# Altium footprint library ICs And Semiconductors THD.PcbLib: 507 footprints (part 31 of 32)
Each footprint in its own frame and in the unit in brackets; x right, y up, seen from the top. Pads: shape width x height; smd on the part's side, far side on the other; paste and mask are expansions set on the pad; w line width, h text height; cw(c..) or ccw(c..) is an arc to the next point about the centre after c.
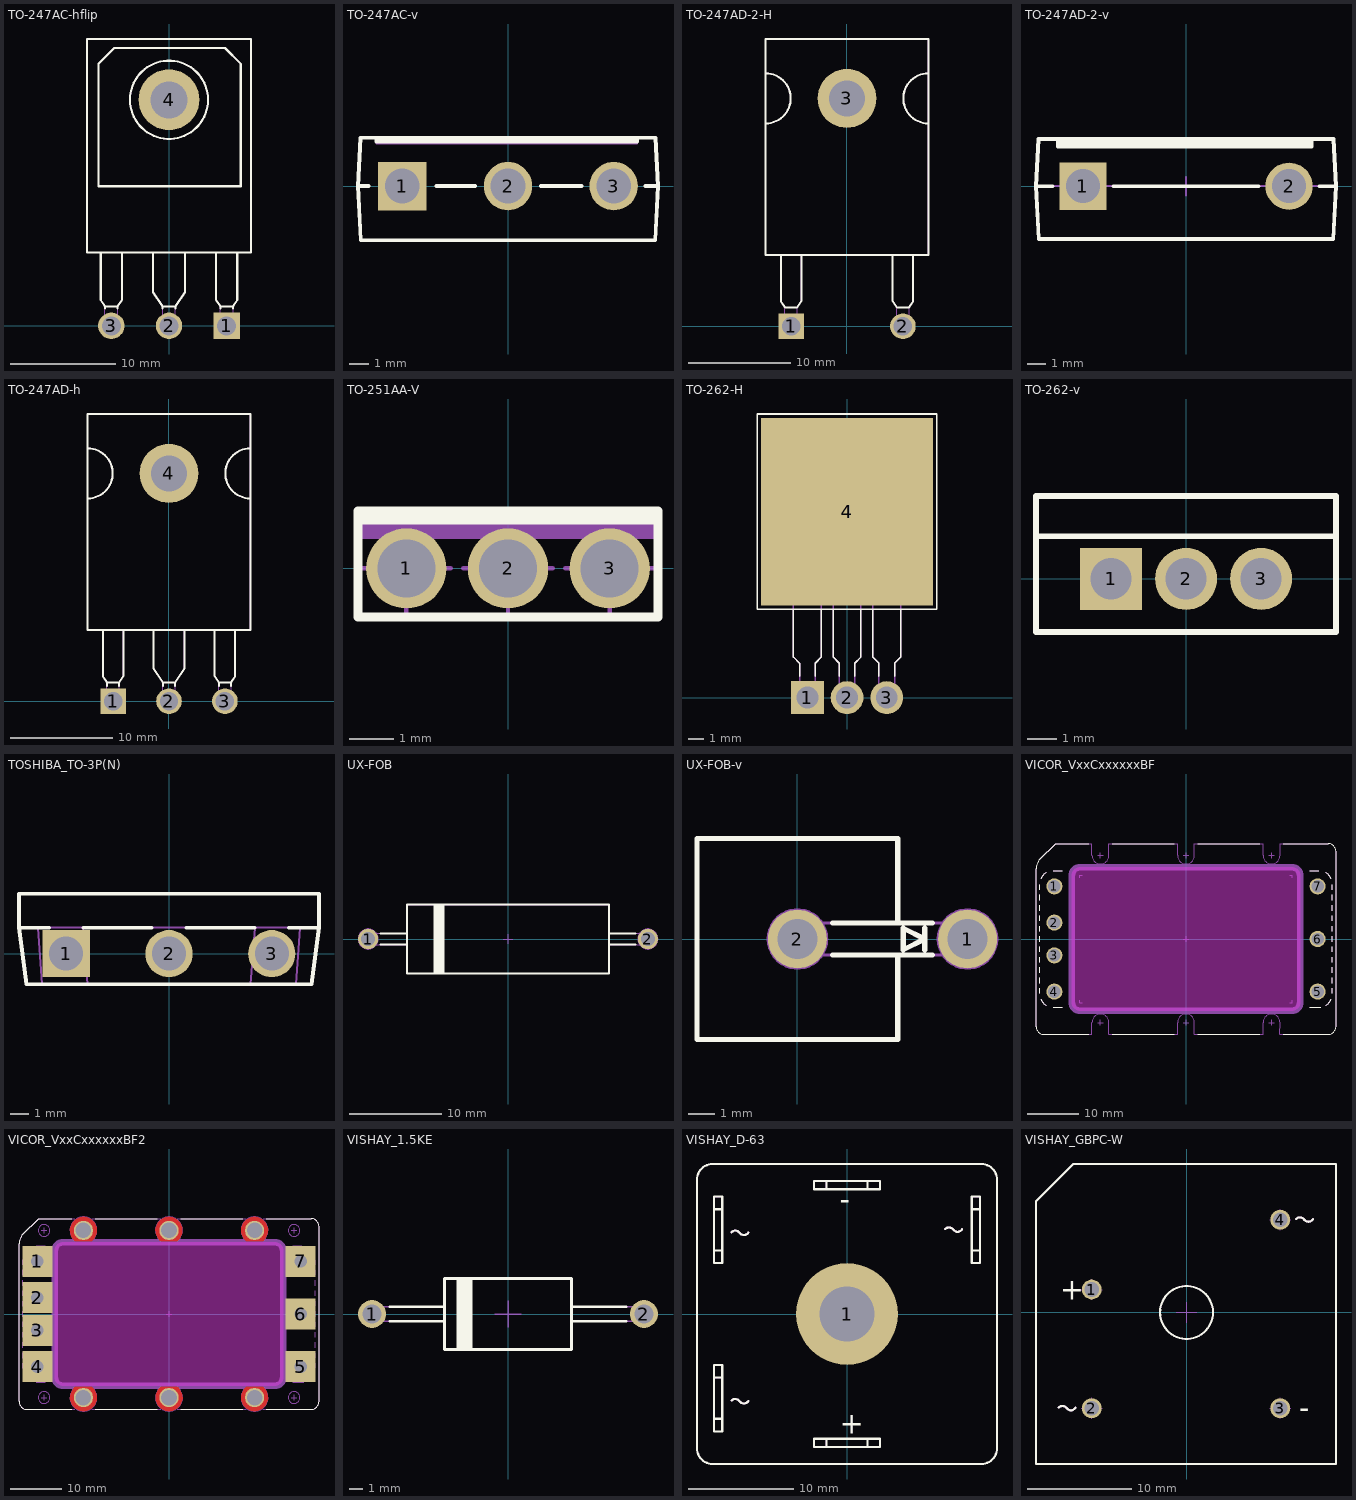
[diagram p30: the footprints below, top view; thin cyan lines are the x and y axes]

## TO-247AC-hflip [mm] "TO-247AC 3-Terminal - Flipped Horizontal Mount"
height 5.3
pads (4):
  rect 2.5x2.5 hole 1.8: 1(5.46,0)
  round 2.5 hole 1.8: 2(0,0) 3(-5.46,0)
  round 5.75 hole 3.5: 4(0,21.39)
Top Overlay:
  circle w0.2: c0,21.39 r3.7
  lines w0.2: -6.46,6.94 -6.46,2.44 -6.06,1.84 ; -6.06,1.65 -6.06,1.84 ; -4.86,1.65 -4.86,1.84 ; -4.46,6.94 -4.46,2.44 -4.86,1.84 ; -1.5,6.94 -1.5,3.19 -0.6,1.84 ; -0.6,1.65 -0.6,1.84 ; 0.6,1.65 0.6,1.84 ; 1.5,6.94 1.5,3.19 0.6,1.84 ; 4.46,6.94 4.46,2.44 4.86,1.84 ; 4.86,1.65 4.86,1.84 ; 6.06,1.65 6.06,1.84 ; 6.46,6.94 6.46,2.44 6.06,1.84 ; -6.06,1.84 -4.86,1.84 ; -0.6,1.84 0.6,1.84 ; 4.86,1.84 6.06,1.84 ; -7.75,6.94 -7.75,27.14 7.75,27.14 7.75,6.94 -7.75,6.94 ; -6.665,13.21 -6.665,24.79 -5.165,26.29 5.295,26.29 6.795,24.79 6.795,13.21 -6.665,13.21
Notvisible:
  lines w0.1: -5.96,0 -5.46,0 ; -5.46,-0.5 -5.46,0 ; -5.46,0.5 -5.46,0 ; -4.96,0 -5.46,0 ; -0.5,0 0,0 ; -0.5,21.39 0,21.39 ; 0,-0.5 0,0 ; 0,0.5 0,0 ; 0,20.89 0,21.39 ; 0,21.89 0,21.39 ; 0.5,0 0,0 ; 0.5,21.39 0,21.39 ; 4.96,0 5.46,0 ; 5.46,-0.5 5.46,0 ; 5.46,0.5 5.46,0 ; 5.96,0 5.46,0
Mechanical 14:
  circle w0.1: c0,21.39 r1.75
  circle w0.1: c0,21.39 r3.7
  lines w0.1: -6.46,6.94 -6.46,2.44 -6.06,1.84 ; -4.46,6.94 -4.46,2.44 -4.86,1.84 ; -1.5,6.94 -1.5,3.19 -0.6,1.84 ; 1.5,6.94 1.5,3.19 0.6,1.84 ; 4.46,6.94 4.46,2.44 4.86,1.84 ; 6.46,6.94 6.46,2.44 6.06,1.84 ; -6.06,1.84 -6.06,-0.5 -4.86,-0.5 -4.86,1.84 ; -6.06,1.84 -4.86,1.84 ; -0.6,1.84 -0.6,-0.5 0.6,-0.5 0.6,1.84 ; -0.6,1.84 0.6,1.84 ; 4.86,1.84 6.06,1.84 ; 4.86,1.84 4.86,-0.5 6.06,-0.5 6.06,1.84 ; -7.75,6.94 -7.75,27.14 7.75,27.14 7.75,6.94 -7.75,6.94 ; -6.665,13.21 -6.665,24.79 -5.165,26.29 5.295,26.29 6.795,24.79 6.795,13.21 -6.665,13.21
3D body "TO-247AC-HFLIP.stp": height 5.3, standoff -3.6, extent -7.75,-0.5 7.75,27.14

## TO-247AC-v [mm] "TO-247AC 3-Terminal - Vertical Mount"
height 25
pads (3):
  rect 2.5x2.5 hole 1.8: 1(-5.46,0)
  round 2.5 hole 1.8: 2(0,0) 3(5.46,0)
Top Overlay:
  lines w0.2: -7.728,0 -7.2,0 ; -6.795,2.5 -6.795,2.3 6.665,2.3 6.665,2.5 ; -3.7,0 -1.7,0 ; 1.7,0 3.8,0 ; 7.1,0 7.75,0 ; 7.75,0 7.61,-2.8 -7.61,-2.8 -7.75,0 -7.62,2.5 7.62,2.5 7.75,0
Notvisible:
  lines w0.1: -5.96,0 -5.46,0 ; -5.46,-0.5 -5.46,0 ; -5.46,0.5 -5.46,0 ; -4.96,0 -5.46,0 ; -0.5,0 0,0 ; 0,-0.5 0,0 ; 0,0.5 0,0 ; 0.5,0 0,0 ; 4.96,0 5.46,0 ; 5.46,-0.5 5.46,0 ; 5.46,0.5 5.46,0 ; 5.96,0 5.46,0
Mechanical 14:
  lines w0.1: -6.795,2.3 6.665,2.3 ; -6.795,2.4 6.665,2.4 ; -6.795,2.5 -6.795,2.2 6.665,2.2 6.665,2.5 ; -7.75,0 -7.61,-2.8 7.61,-2.8 7.75,0 7.62,2.5 -7.62,2.5 -7.75,0
3D body "TO-247AC-V.stp": height 26.75, standoff -3.6, extent -7.75,-2.8 7.75,2.5

## TO-247AD-2-H [mm] "TO-247AD 2-Terminal - Horizontal Mount"
height 5.3
pads (3):
  rect 2.5x2.5 hole 1.8: 1(-5.46,0)
  round 2.5 hole 1.8: 2(5.46,0)
  round 5.75 hole 3.5: 3(0,22.24)
Top Overlay:
  lines w0.2: -7.95,19.79 ccw(c-7.95,22.24) -7.95,24.69 ; -6.46,6.94 -6.46,2.44 -6.06,1.84 -4.86,1.84 -4.46,2.44 -4.46,6.94 ; 4.46,6.94 4.46,2.44 4.86,1.84 6.06,1.84 6.46,2.44 6.46,6.94 ; 7.95,19.79 cw(c7.95,22.24) 7.95,24.69 ; -7.95,6.94 -7.95,28.04 7.95,28.04 7.95,6.94 -7.95,6.94
Notvisible:
  lines w0.1: -5.96,0 -5.46,0 ; -5.46,-0.5 -5.46,0 ; -5.46,0.5 -5.46,0 ; -4.96,0 -5.46,0 ; -0.5,22.24 0,22.24 ; 0,21.74 0,22.24 ; 0,22.74 0,22.24 ; 0.5,22.24 0,22.24 ; 4.96,0 5.46,0 ; 5.46,-0.5 5.46,0 ; 5.46,0.5 5.46,0 ; 5.96,0 5.46,0
Mechanical 14:
  circle w0.1: c0,22.24 r1.75
  lines w0.1: -7.95,19.79 ccw(c-7.95,22.24) -7.95,24.69 ; -6.46,6.94 -6.46,2.44 -6.06,1.84 ; -4.46,6.94 -4.46,2.44 -4.86,1.84 ; 4.46,6.94 4.46,2.44 4.86,1.84 ; 6.46,6.94 6.46,2.44 6.06,1.84 ; 7.95,19.79 cw(c7.95,22.24) 7.95,24.69 ; -6.06,1.84 -6.06,-0.5 -4.86,-0.5 -4.86,1.84 ; -6.06,1.84 -4.86,1.84 ; 4.86,1.84 6.06,1.84 ; 4.86,1.84 4.86,-0.5 6.06,-0.5 6.06,1.84 ; -7.95,6.94 -7.95,28.04 7.95,28.04 7.95,6.94 -7.95,6.94
3D body "TO-247AD-2-H.stp": height 5.3, standoff -3.9, extent -7.95,-0.5 7.95,28.04

## TO-247AD-2-v [mm] "TO-247AD 2-Terminal - Vertical Mount"
height 25
pads (2):
  rect 2.5x2.5 hole 1.8: 1(-5.46,0)
  round 2.5 hole 1.8: 2(5.46,0)
Top Overlay:
  lines w0.2: -7.06,0 -7.95,0 ; -6.795,2.3 6.665,2.3 ; -6.795,2.5 -6.795,2.1 6.665,2.1 6.665,2.5 ; -3.86,0 3.86,0 ; 7.06,0 7.95,0 ; -7.95,0 -7.81,-2.8 7.81,-2.8 7.95,0 ; -7.95,0 -7.82,2.5 7.82,2.5 7.95,0
Notvisible:
  lines w0.1: -5.96,0 -5.46,0 ; -5.46,-0.5 -5.46,0 ; -5.46,0.5 -5.46,0 ; -4.96,0 -5.46,0 ; -0.5,0 0,0 ; 0,-0.5 0,0 ; 0,0.5 0,0 ; 0.5,0 0,0 ; 4.96,0 5.46,0 ; 5.46,-0.5 5.46,0 ; 5.46,0.5 5.46,0 ; 5.96,0 5.46,0
Mechanical 14:
  lines w0.1: -6.795,2.2 6.665,2.2 ; -6.795,2.3 6.665,2.3 ; -6.795,2.4 6.665,2.4 ; -6.795,2.5 -6.795,2.1 6.665,2.1 6.665,2.5 ; -7.95,0 7.95,0 ; -7.95,0 -7.81,-2.8 7.81,-2.8 7.95,0 ; -7.95,0 -7.82,2.5 7.82,2.5 7.95,0
3D body "TO-247AD-2-V.stp": height 26.2, standoff -5.05, extent -7.95,-2.8 7.95,2.5

## TO-247AD-h [mm] "TO-247AD 3-Terminal - Horizontal Mount"
height 5.3
pads (4):
  rect 2.5x2.5 hole 1.8: 1(-5.46,0)
  round 2.5 hole 1.8: 2(0,0) 3(5.46,0)
  round 5.75 hole 3.5: 4(0,22.24)
Top Overlay:
  lines w0.2: -7.95,19.79 ccw(c-7.95,22.24) -7.95,24.69 ; -6.46,6.94 -6.46,2.44 -6.06,1.84 ; -6.06,1.5 -6.06,1.84 ; -4.86,1.5 -4.86,1.84 ; -4.46,6.94 -4.46,2.44 -4.86,1.84 ; -1.5,6.94 -1.5,3.19 -0.6,1.84 ; -0.6,1.5 -0.6,1.84 ; 0.6,1.5 0.6,1.84 ; 1.5,6.94 1.5,3.19 0.6,1.84 ; 4.46,6.94 4.46,2.44 4.86,1.84 ; 4.86,1.5 4.86,1.84 ; 6.06,1.5 6.06,1.84 ; 6.46,6.94 6.46,2.44 6.06,1.84 ; 7.95,19.79 cw(c7.95,22.24) 7.95,24.69 ; -6.06,1.84 -4.86,1.84 ; -0.6,1.84 0.6,1.84 ; 4.86,1.84 6.06,1.84 ; -7.95,6.94 -7.95,28.04 7.95,28.04 7.95,6.94 -7.95,6.94
Notvisible:
  lines w0.1: -5.96,0 -5.46,0 ; -5.46,-0.5 -5.46,0 ; -5.46,0.5 -5.46,0 ; -4.96,0 -5.46,0 ; -0.5,0 0,0 ; -0.5,22.24 0,22.24 ; 0,-0.5 0,0 ; 0,0.5 0,0 ; 0,21.74 0,22.24 ; 0,22.74 0,22.24 ; 0.5,0 0,0 ; 0.5,22.24 0,22.24 ; 4.96,0 5.46,0 ; 5.46,-0.5 5.46,0 ; 5.46,0.5 5.46,0 ; 5.96,0 5.46,0
Mechanical 14:
  circle w0.1: c0,22.24 r1.75
  lines w0.1: -7.95,19.79 ccw(c-7.95,22.24) -7.95,24.69 ; -6.46,6.94 -6.46,2.44 -6.06,1.84 ; -4.46,6.94 -4.46,2.44 -4.86,1.84 ; -1.5,6.94 -1.5,3.19 -0.6,1.84 ; 1.5,6.94 1.5,3.19 0.6,1.84 ; 4.46,6.94 4.46,2.44 4.86,1.84 ; 6.46,6.94 6.46,2.44 6.06,1.84 ; 7.95,19.79 cw(c7.95,22.24) 7.95,24.69 ; -6.06,1.84 -6.06,-0.5 -4.86,-0.5 -4.86,1.84 ; -6.06,1.84 -4.86,1.84 ; -0.6,1.84 -0.6,-0.5 0.6,-0.5 0.6,1.84 ; -0.6,1.84 0.6,1.84 ; 4.86,1.84 6.06,1.84 ; 4.86,1.84 4.86,-0.5 6.06,-0.5 6.06,1.84 ; -7.95,6.94 -7.95,28.04 7.95,28.04 7.95,6.94 -7.95,6.94
3D body "TO-247AD-H.stp": height 5.3, standoff -3.9, extent -7.95,-0.5 7.95,28.04

## TO-251AA-V [mm] "TO-251AA 3-Terminal - Vertical Mount"
height 10.5
pads (3):
  round 1.8 hole 1.3: 1(-2.28,0) 2(0,0) 3(2.28,0)
Top Overlay:
  lines w0.2: -3.365,1.09 3.365,1.09 ; -3.365,-1.09 -3.365,1.29 3.365,1.29 3.365,-1.09 -3.365,-1.09
Notvisible:
  lines w0.1: -3.28,0 -2.28,0 ; -2.28,-1 -2.28,0 ; -2.28,1 -2.28,0 ; -1.28,0 -2.28,0 ; -1,0 0,0 ; 0,-1 0,0 ; 0,1 0,0 ; 1,0 0,0 ; 1.28,0 2.28,0 ; 2.28,-1 2.28,0 ; 2.28,1 2.28,0 ; 3.28,0 2.28,0
Mechanical 14:
  lines w0.1: -3.365,0.71 3.365,0.71 ; -3.365,0.79 3.365,0.79 ; -3.365,0.89 3.365,0.89 ; -3.365,0.99 3.365,0.99 ; -3.365,1.09 3.365,1.09 ; -3.365,1.19 3.365,1.19 ; -3.365,-1.09 3.365,-1.09 3.365,1.29 -3.365,1.29 -3.365,-1.09
3D body "TO-251AA-V.stp": height 10.49, standoff -3.2, extent -3.365,-1.09 3.365,1.29

## TO-262-H [mm] "TO-262 3-Terminal + Tab - Horizontal Mount"
height 4.83
pads (4):
  rect 2.1x2.1 hole 1.4: 1(-2.54,0)
  round 2.1 hole 1.4: 2(0,0) 3(2.54,0)
  rect 11x12 smd paste-5.5: 4(-0.002,11.898)
Top Overlay:
  lines w0.1: -3.43,5.648 -3.43,2.59 -3.04,2.2 -3.04,1.361 ; -2.04,1.361 -2.04,2.2 -1.65,2.59 -1.65,5.648 ; -0.89,5.648 -0.89,2.59 -0.5,2.2 -0.5,1.361 ; 0.5,1.361 0.5,2.2 0.89,2.59 0.89,5.648 ; 1.65,5.648 1.65,2.59 2.04,2.2 2.04,1.361 ; 3.04,1.361 3.04,2.2 3.43,2.59 3.43,5.648 ; -5.752,5.648 -5.752,18.148 5.748,18.148 5.748,5.648 -5.752,5.648
Notvisible:
  lines w0.1: -3.04,0 -2.54,0 ; -2.54,-0.5 -2.54,0 ; -2.54,0.5 -2.54,0 ; -2.04,0 -2.54,0 ; -0.5,0 0,0 ; 0,-0.5 0,0 ; 0,0.5 0,0 ; 0.5,0 0,0 ; 2.04,0 2.54,0 ; 2.54,-0.5 2.54,0 ; 2.54,0.5 2.54,0 ; 3.04,0 2.54,0
  text "This Pad" at -3.8,9.75 h1
  text "Mask on" at -3.5,11.425 h1
  text "No Paste" at -3.725,13 h1
Mechanical 13:
  lines w0.2: -5.083,6.7 -5.083,6.3 -4.5,6.3
Mechanical 14:
  lines w0.1: -5.083,15.815 5.077,15.815 ; -3.43,6.3 -3.43,2.59 -3.04,2.2 -3.04,-0.25 -2.04,-0.25 -2.04,2.2 -1.65,2.59 -1.65,6.3 ; -0.89,6.3 -0.89,2.59 -0.5,2.2 -0.5,-0.25 0.5,-0.25 0.5,2.2 0.89,2.59 0.89,6.3 ; 1.65,6.3 1.65,2.59 2.04,2.2 2.04,-0.25 3.04,-0.25 3.04,2.2 3.43,2.59 3.43,6.3 ; -5.083,6.3 -5.083,16.86 -3.338,17.495 3.333,17.495 5.077,16.86 5.077,6.3 -5.083,6.3
3D body "TO-262-H.stp": height 4.6, standoff -3.6, extent -5.082,-0.25 5.078,17.495

## TO-262-v [mm] "TO-262 3-Terminal - Vertical Mount"
height 15.01
pads (3):
  rect 2.1x2.1 hole 1.4: 1(-2.54,0)
  round 2.1 hole 1.4: 2(0,0) 3(2.54,0)
Top Overlay:
  lines w0.2: -5.082,1.445 5.078,1.445 ; -5.082,-1.795 -5.082,2.805 5.078,2.805 5.078,-1.795 -5.082,-1.795
Notvisible:
  lines w0.1: -3.04,0 -2.54,0 ; -2.54,-0.5 -2.54,0 ; -2.54,0.5 -2.54,0 ; -2.04,0 -2.54,0 ; -0.5,0 0,0 ; 0,-0.5 0,0 ; 0,0.5 0,0 ; 0.5,0 0,0 ; 2.04,0 2.54,0 ; 2.54,-0.5 2.54,0 ; 2.54,0.5 2.54,0 ; 3.04,0 2.54,0
Mechanical 14:
  lines w0.1: -5.082,1.445 5.078,1.445 ; -5.082,-1.795 -5.082,2.805 5.078,2.805 5.078,-1.795 -5.082,-1.795
3D body "TO-262-V.stp": height 15.3, standoff -3.6, extent -5.082,-1.795 5.078,2.805

## TOSHIBA_TO-3P(N) [mm] "TOSHIBA TO-3P(N) 3-Terminal - Vertical Mount"
height 25.5
pads (3):
  rect 2.5x2.5 hole 1.8: 1(-5.45,0)
  round 2.5 hole 1.8: 2(0,0) 3(5.45,0)
Top Overlay:
  lines w0.2: -6.362,1.375 -7.95,1.375 ; -4.538,1.375 -0.912,1.375 ; 0.912,1.375 4.538,1.375 ; 6.362,1.375 7.95,1.375 ; -7.95,1.375 -7.55,-1.625 0,-1.625 7.55,-1.625 7.95,1.375 ; -7.95,1.375 -7.95,3.175 0,3.175 7.95,3.175 7.95,1.375
Notvisible:
  lines w0.1: -6.45,0 -5.45,0 ; -5.45,-1 -5.45,0 ; -5.45,1 -5.45,0 ; -4.45,0 -5.45,0 ; -1,0 0,0 ; 0,-1 0,0 ; 0,1 0,0 ; 1,0 0,0 ; 4.45,0 5.45,0 ; 5.45,-1 5.45,0 ; 5.45,1 5.45,0 ; 6.45,0 5.45,0
Mechanical 14:
  lines w0.1: -6.95,1.375 -6.724,-1.625 ; -4.55,1.375 -4.324,-1.625 ; 4.324,-1.625 4.55,1.375 ; 6.724,-1.625 6.95,1.375 ; -7.95,1.375 0,1.375 7.95,1.375 ; -7.95,1.375 -7.55,-1.625 0,-1.625 7.55,-1.625 7.95,1.375 ; -7.95,1.375 -7.95,3.175 0,3.175 7.95,3.175 7.95,1.375
3D body "TOSHIBA_TO-3P(N)_v.stp": height 25.5, standoff -3.8, extent -7.95,-1.625 7.95,3.175

## UX-FOB [mm] "Diode High Voltage, Rectangular; Lead Spacing 30.48mm, Lead Dia. 1.2mm, Body Length 22mm, Body Height 7.5mm"
height 7.5
pads (2):
  round 2.2 hole 1.5: 1(-15.24,0) 2(15.24,0)
Top Overlay:
  lines w0.2: -13.92,-0.6 -11,-0.6 ; -13.92,0.6 -11,0.6 ; -8,-3.75 -8,3.75 ; -7.9,-3.75 -7.9,3.75 ; -7.8,-3.75 -7.8,3.75 ; -7.7,-3.75 -7.7,3.75 ; -7.6,-3.75 -7.6,3.75 ; -7.5,-3.75 -7.5,3.75 ; -7.4,-3.75 -7.4,3.75 ; -7.3,-3.75 -7.3,3.75 ; -7.2,-3.75 -7.2,3.75 ; -7.1,-3.75 -7.1,3.75 ; -7,-3.75 -7,3.75 ; 11,-0.6 13.92,-0.6 ; 11,0.6 13.92,0.6 ; -11,-3.75 11,-3.75 11,3.75 -11,3.75 -11,-3.75
Notvisible:
  circle w0.05: c-15.24,0 r0.75
  circle w0.05: c-15.24,0 r1.1
  circle w0.05: c15.24,0 r1.1
  circle w0.05: c15.24,0 r0.75
  lines w0.05: -15.74,0 -15.24,0 ; -15.24,-0.5 -15.24,0 ; -15.24,0.5 -15.24,0 ; -14.74,0 -15.24,0 ; -0.5,0 0,0 ; 0,-0.5 0,0 ; 0,0.5 0,0 ; 0.5,0 0,0 ; 14.74,0 15.24,0 ; 15.24,-0.5 15.24,0 ; 15.24,0.5 15.24,0 ; 15.74,0 15.24,0
Mechanical 14:
  lines w0.1: -11,-0.6 -15.24,-0.6 cw(c-15.24,0) -15.24,0.6 -11,0.6 ; -8,-3.75 -8,3.75 ; -7.9,-3.75 -7.9,3.75 ; -7.8,-3.75 -7.8,3.75 ; -7.7,-3.75 -7.7,3.75 ; -7.6,-3.75 -7.6,3.75 ; -7.5,-3.75 -7.5,3.75 ; -7.4,-3.75 -7.4,3.75 ; -7.3,-3.75 -7.3,3.75 ; -7.2,-3.75 -7.2,3.75 ; -7.1,-3.75 -7.1,3.75 ; -7,-3.75 -7,3.75 ; 11,-0.6 15.24,-0.6 ccw(c15.24,0) 15.24,0.6 11,0.6 ; -11,-3.75 11,-3.75 11,3.75 -11,3.75 -11,-3.75
3D body "UX-FOB_Part2.stp": height 4.35, standoff -3.1, extent 6,-0.6 15.84,0.6
3D body "UX-FOB_Part2.stp": height 4.35, standoff -3.1, extent -15.84,-0.6 -6,0.6
3D body "UX-FOB_Part1.stp": height 7.5, standoff 0, extent -11,-3.75 11,3.75

## UX-FOB-v [mm] "Diode High Voltage, Axial, Vertical Mount; Lead Spacing 6.35mm, Lead Dia. 1.2mm, Body Length 22mm, Body Height 7.5mm"
height 25.6
pads (2):
  round 2.2 hole 1.5: 1(6.35,0) 2(0,0)
Top Overlay:
  lines w0.2: 1.32,-0.6 5.03,-0.6 ; 1.32,0.6 5.03,0.6 ; 3.75,-0.6 3.75,-3.75 -3.75,-3.75 -3.75,3.75 3.75,3.75 3.75,0.6 ; 4.75,-0.4 4.75,0.4 ; 3.95,-0.4 4.75,0 3.95,0.4 3.95,-0.4
Notvisible:
  circle w0.1: c6.35,0 r1.1
  circle w0.1: c6.35,0 r0.75
  circle w0.1: c0,0 r1.1
  circle w0.1: c0,0 r0.75
  lines w0.1: -0.5,0 0,0 ; 0,-0.5 0,0 ; 0,0.5 0,0 ; 0.5,0 0,0 ; 5.85,0 6.35,0 ; 6.35,-0.5 6.35,0 ; 6.35,0.5 6.35,0 ; 6.85,0 6.35,0
Mechanical 14:
  lines w0.1: 3.75,-0.6 3.75,-3.75 -3.75,-3.75 -3.75,3.75 3.75,3.75 3.75,0.6 ; 4.75,-0.4 4.75,0.4 ; 0,-0.6 cw(c0,0) 0,0.6 6.35,0.6 cw(c6.35,0) 6.35,-0.6 0,-0.6 ; 3.95,-0.4 4.75,0 3.95,0.4 3.95,-0.4
3D body "UX-FOB-v_Part2.stp": height 25.6, standoff -3.1, extent -0.6,-0.6 6.95,0.6
3D body "UX-FOB-v_Part1.stp": height 22, standoff -3.1, extent -3.75,-3.75 3.75,3.75

## VICOR_VxxCxxxxxxBF [mm] "VICOR  Micro DC-DC Converters, Short Pin RoHS, Slotted Baseplate"
height 12.7
pads (7):
  round 3.1 hole 2.4: 1(-25.4,10.16) 2(-25.4,3.175) 3(-25.4,-3.175) 4(-25.4,-10.16) 5(25.4,-10.16) 6(25.4,0) 7(25.4,10.16)
Top Overlay:
  lines w0.2: -28.194,-10.517 -28.194,-9.5 ; -28.194,-8.5 -28.194,-7.5 ; -28.194,-6.5 -28.194,-5.5 ; -28.194,-4.5 -28.194,-3.5 ; -28.194,-2.5 -28.194,-1.5 ; -28.194,-0.5 -28.194,0.5 ; -28.194,1.5 -28.194,2.5 ; -28.194,3.5 -28.194,4.5 ; -28.194,5.5 -28.194,6.5 ; -28.194,7.5 -28.194,8.5 ; -28.194,9.5 -28.194,10.517 ; -28,-11.642 ccw(c-25.655,-10.669) -27,-12.822 ; -28,11.642 cw(c-25.655,10.669) -27,12.822 ; -25.655,-13.208 -23.911,-13.208 ; -25.655,13.208 -23.911,13.208 ; -18.82,-18.415 -27.432,-18.415 cw(c-27.432,-16.891) -28.956,-16.891 -28.956,13.553 cw(c-26.416,13.553) -28.212,15.349 -25.146,18.415 -18.82,18.415 ; -14.2,-18.415 -2.31,-18.415 ; -14.2,18.415 -2.31,18.415 ; 2.31,-18.415 14.2,-18.415 ; 2.31,18.415 14.2,18.415 ; 18.82,-18.415 27.432,-18.415 ccw(c27.432,-16.891) 28.956,-16.891 28.956,16.891 ccw(c27.432,16.891) 27.432,18.415 18.82,18.415 ; 23.911,-13.208 25.655,-13.208 ccw(c25.655,-10.669) 26,-13.184 ; 23.911,13.208 25.655,13.208 ; 27,-12.822 ccw(c25.655,-10.669) 28,-11.642 ; 27,12.822 cw(c25.655,10.669) 28,11.642 ; 28.194,-10.517 28.194,-9.5 ; 28.194,-8.5 28.194,-7.5 ; 28.194,-6.5 28.194,-5.5 ; 28.194,-4.5 28.194,-3.5 ; 28.194,-2.5 28.194,-1.5 ; 28.194,-0.5 28.194,0.5 ; 28.194,1.5 28.194,2.5 ; 28.194,3.5 28.194,4.5 ; 28.194,5.5 28.194,6.5 ; 28.194,7.5 28.194,8.5 ; 28.194,9.5 28.194,10.517
Keep-Out Layer:
  board cut-out: -20.52,-13.836 -20.668,-13.836 -20.958,-13.778 -21.231,-13.665 -21.476,-13.501 -21.685,-13.292 -21.849,-13.046 -21.962,-12.773 -22.02,-12.483 -22.02,-12.336 -22.02,12.35 -22.02,12.498 -21.962,12.788 -21.849,13.061 -21.685,13.306 -21.476,13.515 -21.231,13.68 -20.958,13.793 -20.668,13.85 -20.52,13.85 20.52,13.85 20.668,13.85 20.958,13.793 21.231,13.68 21.476,13.515 21.685,13.306 21.849,13.061 21.962,12.788 22.02,12.498 22.02,12.35 22.02,-12.336 22.02,-12.483 21.962,-12.773 21.849,-13.046 21.685,-13.292 21.476,-13.501 21.231,-13.665 20.958,-13.778 20.668,-13.836 20.52,-13.836
Mechanical 1:
  lines w1.27: -22.02,-12.343 ccw(c-20.52,-12.343) -20.52,-13.843 20.52,-13.843 ccw(c20.52,-12.343) 22.02,-12.343 22.02,12.343 ccw(c20.52,12.343) 20.52,13.843 -20.52,13.843 ccw(c-20.52,12.343) -22.02,12.343 -22.02,-12.343
Notvisible:
  lines w0.1: -25.9,-10.16 -25.4,-10.16 ; -25.9,-3.175 -25.4,-3.175 ; -25.9,3.175 -25.4,3.175 ; -25.9,10.16 -25.4,10.16 ; -25.4,-10.66 -25.4,-10.16 ; -25.4,-9.66 -25.4,-10.16 ; -25.4,-3.675 -25.4,-3.175 ; -25.4,-2.675 -25.4,-3.175 ; -25.4,2.675 -25.4,3.175 ; -25.4,3.675 -25.4,3.175 ; -25.4,9.66 -25.4,10.16 ; -25.4,10.66 -25.4,10.16 ; -24.9,-10.16 -25.4,-10.16 ; -24.9,-3.175 -25.4,-3.175 ; -24.9,3.175 -25.4,3.175 ; -24.9,10.16 -25.4,10.16 ; -20.52,-11.843 -20.52,-12.343 -20.02,-12.343 ; -20.52,11.843 -20.52,12.343 -20.02,12.343 ; -17.01,-16.129 -16.51,-16.129 ; -17.01,16.129 -16.51,16.129 ; -16.51,-16.629 -16.51,-16.129 ; -16.51,-15.629 -16.51,-16.129 ; -16.51,15.629 -16.51,16.129 ; -16.51,16.629 -16.51,16.129 ; -16.01,-16.129 -16.51,-16.129 ; -16.01,16.129 -16.51,16.129 ; -0.5,-16.129 0,-16.129 ; -0.5,0 0,0 ; -0.5,16.129 0,16.129 ; 0,-16.629 0,-16.129 ; 0,-15.629 0,-16.129 ; 0,-0.5 0,0 ; 0,0.5 0,0 ; 0,15.629 0,16.129 ; 0,16.629 0,16.129 ; 0.5,-16.129 0,-16.129 ; 0.5,0 0,0 ; 0.5,16.129 0,16.129 ; 16.01,-16.129 16.51,-16.129 ; 16.01,16.129 16.51,16.129 ; 16.51,-16.629 16.51,-16.129 ; 16.51,-15.629 16.51,-16.129 ; 16.51,15.629 16.51,16.129 ; 16.51,16.629 16.51,16.129 ; 17.01,-16.129 16.51,-16.129 ; 17.01,16.129 16.51,16.129 ; 20.02,-12.343 20.52,-12.343 20.52,-11.843 ; 20.02,12.343 20.52,12.343 20.52,11.843 ; 24.9,-10.16 25.4,-10.16 ; 24.9,0 25.4,0 ; 24.9,10.16 25.4,10.16 ; 25.4,-10.66 25.4,-10.16 ; 25.4,-9.66 25.4,-10.16 ; 25.4,-0.5 25.4,0 ; 25.4,0.5 25.4,0 ; 25.4,9.66 25.4,10.16 ; 25.4,10.66 25.4,10.16 ; 25.9,-10.16 25.4,-10.16 ; 25.9,0 25.4,0 ; 25.9,10.16 25.4,10.16 ; -22.02,-12.343 ccw(c-20.52,-12.343) -20.52,-13.843 20.52,-13.843 ccw(c20.52,-12.343) 22.02,-12.343 22.02,12.343 ccw(c20.52,12.343) 20.52,13.843 -20.52,13.843 ccw(c-20.52,12.343) -22.02,12.343 -22.02,-12.343
Mechanical 14:
  lines w0.1: -28.956,-16.891 -28.956,13.553 ; -28.212,15.349 -25.146,18.415 -18.148,18.415 -18.148,16.129 ccw(c-16.51,16.129) -14.872,16.129 -14.872,18.415 -1.638,18.415 -1.638,16.129 ccw(c0,16.129) 1.638,16.129 1.638,18.415 14.872,18.415 14.872,16.129 ccw(c16.51,16.129) 18.148,16.129 18.148,18.415 27.432,18.415 ; -28.194,-10.517 -28.194,-9.5 ; -28.194,-8.5 -28.194,-7.5 ; -28.194,-6.5 -28.194,-5.5 ; -28.194,-4.5 -28.194,-3.5 ; -28.194,-2.5 -28.194,-1.5 ; -28.194,-0.5 -28.194,0.5 ; -28.194,1.5 -28.194,2.5 ; -28.194,3.5 -28.194,4.5 ; -28.194,5.5 -28.194,6.5 ; -28.194,7.5 -28.194,8.5 ; -28.194,9.5 -28.194,10.517 ; -28,-11.642 ccw(c-25.655,-10.669) -27,-12.822 ; -28,11.642 cw(c-25.655,10.669) -27,12.822 ; -27.432,-18.415 -18.148,-18.415 -18.148,-16.129 cw(c-16.51,-16.129) -14.872,-16.129 -14.872,-18.415 -1.638,-18.415 -1.638,-16.129 cw(c0,-16.129) 1.638,-16.129 1.638,-18.415 14.872,-18.415 14.872,-16.129 cw(c16.51,-16.129) 18.148,-16.129 18.134,-18.415 27.432,-18.415 ; -25.655,-13.208 -23.911,-13.208 ; -25.655,13.208 -23.911,13.208 ; 23.911,-13.208 25.655,-13.208 ccw(c25.655,-10.669) 26,-13.184 ; 23.911,13.208 25.655,13.208 ; 27,-12.822 ccw(c25.655,-10.669) 28,-11.642 ; 27,12.822 cw(c25.655,10.669) 28,11.642 ; 28.194,-10.517 28.194,-9.5 ; 28.194,-8.5 28.194,-7.5 ; 28.194,-6.5 28.194,-5.5 ; 28.194,-4.5 28.194,-3.5 ; 28.194,-2.5 28.194,-1.5 ; 28.194,-0.5 28.194,0.5 ; 28.194,1.5 28.194,2.5 ; 28.194,3.5 28.194,4.5 ; 28.194,5.5 28.194,6.5 ; 28.194,7.5 28.194,8.5 ; 28.194,9.5 28.194,10.517 ; 28.956,-16.891 28.956,16.891